# Altium footprint library goldpin_female_pcb.PcbLib: 81 footprints (part 2 of 6)
Each footprint in its own frame and in the unit in brackets; x right, y up, seen from the top. Pads: shape width x height; smd on the part's side, far side on the other; paste and mask are expansions set on the pad; w line width, h text height; cw(c..) or ccw(c..) is an arc to the next point about the centre after c.
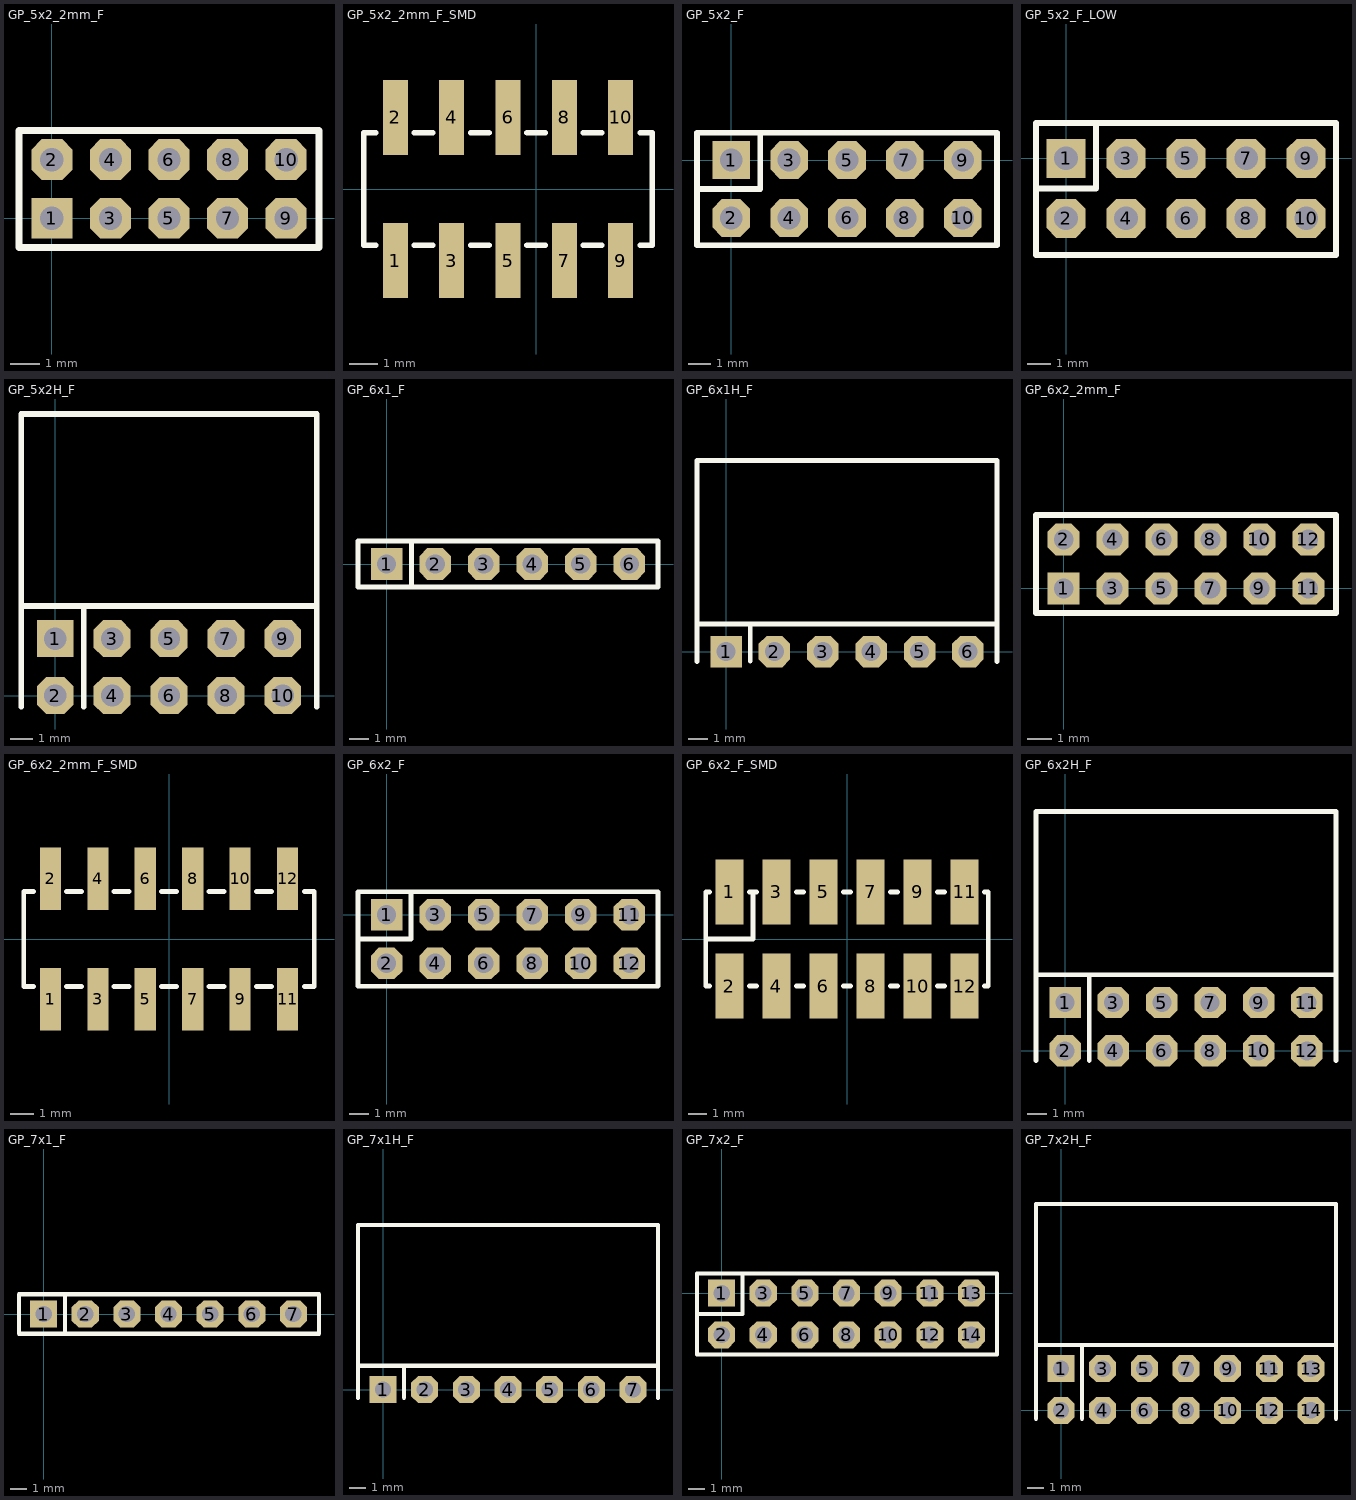
[diagram p1: the footprints below, top view; thin cyan lines are the x and y axes]

## GP_5x2_2mm_F [mm]
height 4.45
pads (10):
  rect 1.4x1.4 hole 0.8: 1(0,0)
  oct 1.4x1.4 hole 0.8: 2(0,2) 3(2,0) 4(2,2) 5(4,0) 6(4,2) 7(6,0) 8(6,2) 9(8,0) 10(8,2)
Top Overlay:
  lines w0.254: -1.125,-1 -1.125,2.999 9.125,2.999 9.125,-1 -1.125,-1
3D body "Samtec3dPS-MMS.STEP": height 4.44, standoff -2.92, extent -1.125,-0.999 9.116,2.999

## GP_5x2_2mm_F_SMD [mm]
pads (10):
  rect 0.89x2.65 smd: 1(-5,-2.54) 2(-5,2.54) 3(-3,-2.54) 4(-3,2.54) 5(-1,-2.54) 6(-1,2.54) 7(1,-2.54) 8(1,2.54) 9(3,-2.54) 10(3,2.54)
Top Overlay:
  lines w0.2: -5.7,-2 -6.125,-2 -6.125,2 -5.7,2 ; -4.325,-2 -3.675,-2 ; -4.325,2 -3.675,2 ; -2.325,-2 -1.675,-2 ; -2.325,2 -1.675,2 ; -0.325,-2 0.325,-2 ; -0.325,2 0.325,2 ; 1.675,-2 2.325,-2 ; 1.675,2 2.325,2 ; 3.7,-2 4.125,-2 4.125,2 3.7,2
3D body "Samtec-MMS-105-2-L-DV.STEP": height 4.44, standoff -0.05, extent -6.121,-3.218 4.121,3.218

## GP_5x2_F [mil]
pads (10):
  rect 65x65 hole 39.37: 1(0,0)
  oct 65x65 hole 39.37: 2(0,-100) 3(100,0) 4(100,-100) 5(200,0) 6(200,-100) 7(300,0) 8(300,-100) 9(400,0) 10(400,-100)
Top Overlay:
  lines w10: -59.06,-50 50,-50 50,47.24 ; -59.06,-147.24 459.06,-147.24 459.06,47.24 -59.06,47.24 -59.06,-147.24
3D body "Samtec-SSW-105-01-G-D.step": height 335, standoff -104, extent -60,-147.49 460,47.51

## GP_5x2_F_LOW [mil]
pads (10):
  rect 65x65 hole 39.37: 1(0,0)
  oct 65x65 hole 39.37: 2(0,-100) 3(100,0) 4(100,-100) 5(200,0) 6(200,-100) 7(300,0) 8(300,-100) 9(400,0) 10(400,-100)
Top Overlay:
  lines w10: -50,-50 50,-50 50,59.06 ; -50,-161.42 -50,59.06 449.76,59.06 449.76,-161.42 -50,-161.42
3D body "Samtec-CES-105-01-G-D.step": height 200.79, standoff -127.21, extent -51.18,-161.02 448.82,58.98

## GP_5x2H_F [mil]
pads (10):
  rect 65x65 hole 39.37: 1(0,100)
  oct 65x65 hole 39.37: 2(0,0) 3(100,100) 4(100,0) 5(200,100) 6(200,0) 7(300,100) 8(300,0) 9(400,100) 10(400,0)
Top Overlay:
  lines w10: -60,-20 -60,495 460,495 460,-20 ; -60,157.24 456.69,157.24 ; 50,-20 50,157.24
3D body "Samtec-SSW-105-22-G-D-RA.step": height 197.89, standoff -97.11, extent -59.06,-10.87 460.94,492.13

## GP_6x1_F [mil]
pads (6):
  rect 65x65 hole 39.37: 1(0,0)
  oct 65x65 hole 39.37: 2(100,0) 3(200,0) 4(300,0) 5(400,0) 6(500,0)
Top Overlay:
  lines w10: 51.18,-47.24 51.18,47.24 ; -59.06,-47.24 -59.06,47.24 559.06,47.24 559.06,-47.24 -59.06,-47.24
3D body "Samtec-SSW-106-01-G-S.step": height 335, standoff -104, extent -60,-47.49 560,47.51

## GP_6x1H_F [mil]
pads (6):
  rect 65x65 hole 39.37: 1(0,0)
  oct 65x65 hole 39.37: 2(100,0) 3(200,0) 4(300,0) 5(400,0) 6(500,0)
Top Overlay:
  lines w10: -60,-20 -60,395 560,395 560,-20 ; -60,57.24 560,57.24 ; 50,-19.68 50,57.24
3D body "Samtec-SSW-106-22-G-S-RA.step": height 96.71, standoff -98.29, extent -60,-10 560,393

## GP_6x2_2mm_F [mm]
height 4.45
pads (12):
  rect 1.3x1.3 hole 0.8: 1(0,0)
  oct 1.3x1.3 hole 0.8: 2(0,2) 3(2,0) 4(2,2) 5(4,0) 6(4,2) 7(6,0) 8(6,2) 9(8,0) 10(8,2) 11(10,0) 12(10,2)
Top Overlay:
  lines w0.254: -1.125,-1 -1.125,2.999 11.125,2.999 11.125,-1 -1.125,-1
3D body "Samtec-MMS-106-1-L-DV.STEP": height 4.44, standoff -2.92, extent -1.125,-0.999 11.115,2.999

## GP_6x2_2mm_F_SMD [mm]
pads (12):
  rect 0.89x2.65 smd: 1(-5,-2.54) 2(-5,2.54) 3(-3,-2.54) 4(-3,2.54) 5(-1,-2.54) 6(-1,2.54) 7(1,-2.54) 8(1,2.54) 9(3,-2.54) 10(3,2.54) 11(5,-2.54) 12(5,2.54)
Top Overlay:
  lines w0.2: -5.7,-2 -6.125,-2 -6.125,2 -5.7,2 ; -4.325,-2 -3.675,-2 ; -4.325,2 -3.675,2 ; -2.325,-2 -1.675,-2 ; -2.325,2 -1.675,2 ; -0.325,-2 0.325,-2 ; -0.325,2 0.325,2 ; 1.675,-2 2.325,-2 ; 1.675,2 2.325,2 ; 3.675,-2 4.325,-2 ; 3.675,2 4.325,2 ; 5.7,-2 6.125,-2 6.125,2 5.7,2
3D body "Samtec-MMS-106-2-L-DV.STEP": height 4.44, standoff -0.05, extent -6.125,-3.218 6.115,3.218

## GP_6x2_F [mil]
pads (12):
  rect 65x65 hole 39.37: 1(0,0)
  oct 65x65 hole 39.37: 2(0,-100) 3(100,0) 4(100,-100) 5(200,0) 6(200,-100) 7(300,0) 8(300,-100) 9(400,0) 10(400,-100) 11(500,0) 12(500,-100)
Top Overlay:
  lines w10: -59.06,-50 50,-50 50,47.51 ; -59.06,-147.49 559.06,-147.49 559.06,47.51 -59.06,47.51 -59.06,-147.49
3D body "Samtec-SSW-106-01-G-D.step": height 335, standoff -104, extent -60,-147.49 560,47.51

## GP_6x2_F_SMD [mm]
pads (12):
  rect 1.5x3.5 smd: 1(-6.35,2.54) 2(-6.35,-2.54) 3(-3.81,2.54) 4(-3.81,-2.54) 5(-1.27,2.54) 6(-1.27,-2.54) 7(1.27,2.54) 8(1.27,-2.54) 9(3.81,2.54) 10(3.81,-2.54) 11(6.35,2.54) 12(6.35,-2.54)
Top Overlay:
  lines w0.254: -7.62,0 -5.08,0 -5.08,2.54 -5.27,2.54 -4.889,2.54 ; -7.429,-2.54 -7.62,-2.54 -7.62,2.54 -7.429,2.54 ; -5.08,-2.54 -5.27,-2.54 -4.889,-2.54 ; -2.73,-2.54 -2.349,-2.54 ; -2.73,2.54 -2.349,2.54 ; -0.19,-2.54 0.191,-2.54 ; -0.19,2.54 0.191,2.54 ; 2.35,-2.54 2.731,-2.54 ; 2.35,2.54 2.731,2.54 ; 4.89,-2.54 5.271,-2.54 ; 4.89,2.54 5.271,2.54 ; 7.43,-2.54 7.62,-2.54 7.62,2.54 7.43,2.54
3D body "SSM-106-S-DV.stp": height 7.37, standoff -0.05, extent -7.62,-3.518 7.62,3.518

## GP_6x2H_F [mil]
pads (12):
  rect 65x65 hole 39.37: 1(0,100)
  oct 65x65 hole 39.37: 2(0,0) 3(100,100) 4(100,0) 5(200,100) 6(200,0) 7(300,100) 8(300,0) 9(400,100) 10(400,0) 11(500,100) 12(500,0)
Top Overlay:
  lines w10: -60,-20 -60,495 560,495 560,-20 ; -60,157.24 560,157.24 ; 50,-20 50,157.24
3D body "Samtec-SSW-106-22-G-D-RA.step": height 197.89, standoff -97.11, extent -59.06,-10.87 560.94,492.13

## GP_7x1_F [mil]
pads (7):
  rect 65x65 hole 39.37: 1(0,0)
  oct 65x65 hole 39.37: 2(100,0) 3(200,0) 4(300,0) 5(400,0) 6(500,0) 7(600,0)
Top Overlay:
  lines w10: 51.18,-47.24 51.18,47.24 ; -59.06,-47.24 661.42,-47.24 661.42,47.24 -59.06,47.24 -59.06,-47.24
3D body "Samtec-SSW-107-01-G-S.step": height 335, standoff -104, extent -60,-47.5 660,47.5

## GP_7x1H_F [mil]
pads (7):
  rect 65x65 hole 39.37: 1(0,0)
  oct 65x65 hole 39.37: 2(100,0) 3(200,0) 4(300,0) 5(400,0) 6(500,0) 7(600,0)
Top Overlay:
  lines w10: -60,-20 -60,395 660,395 660,-20 ; -60,57.24 660,57.24 ; 50,-19.68 50,57.24
3D body "Samtec-SSW-107-22-G-S-RA.step": height 96.71, standoff -98.29, extent -60,-10 660,393

## GP_7x2_F [mil]
pads (14):
  rect 65x65 hole 39.37: 1(0,0)
  oct 65x65 hole 39.37: 2(0,-100) 3(100,0) 4(100,-100) 5(200,0) 6(200,-100) 7(300,0) 8(300,-100) 9(400,0) 10(400,-100) 11(500,0) 12(500,-100) 13(600,0) 14(600,-100)
Top Overlay:
  lines w10: -59.06,-50 50,-50 50,47.51 ; -59.06,-147.49 -59.06,47.51 661.42,47.51 661.42,-147.49 -59.06,-147.49
3D body "Samtec-SSW-107-01-G-D.step": height 335, standoff -104, extent -60,-147.49 660,47.51

## GP_7x2H_F [mil]
pads (14):
  rect 65x65 hole 39.37: 1(0,100)
  oct 65x65 hole 39.37: 2(0,0) 3(100,100) 4(100,0) 5(200,100) 6(200,0) 7(300,100) 8(300,0) 9(400,100) 10(400,0) 11(500,100) 12(500,0) 13(600,100) 14(600,0)
Top Overlay:
  lines w10: -60,-20 -60,495 660,495 660,-20 ; -60,157.24 660,157.24 ; 50,-20 50,157.24
3D body "Samtec-SSW-107-22-G-D-RA.step": height 197.89, standoff -97.11, extent -59.06,-10.87 660.94,492.13